# Altium footprint library HoangLong_Library.PcbLib: 81 footprints (part 1 of 6)
Each footprint in its own frame and in the unit in brackets; x right, y up, seen from the top. Pads: shape width x height; smd on the part's side, far side on the other; paste and mask are expansions set on the pad; w line width, h text height; cw(c..) or ccw(c..) is an arc to the next point about the centre after c.
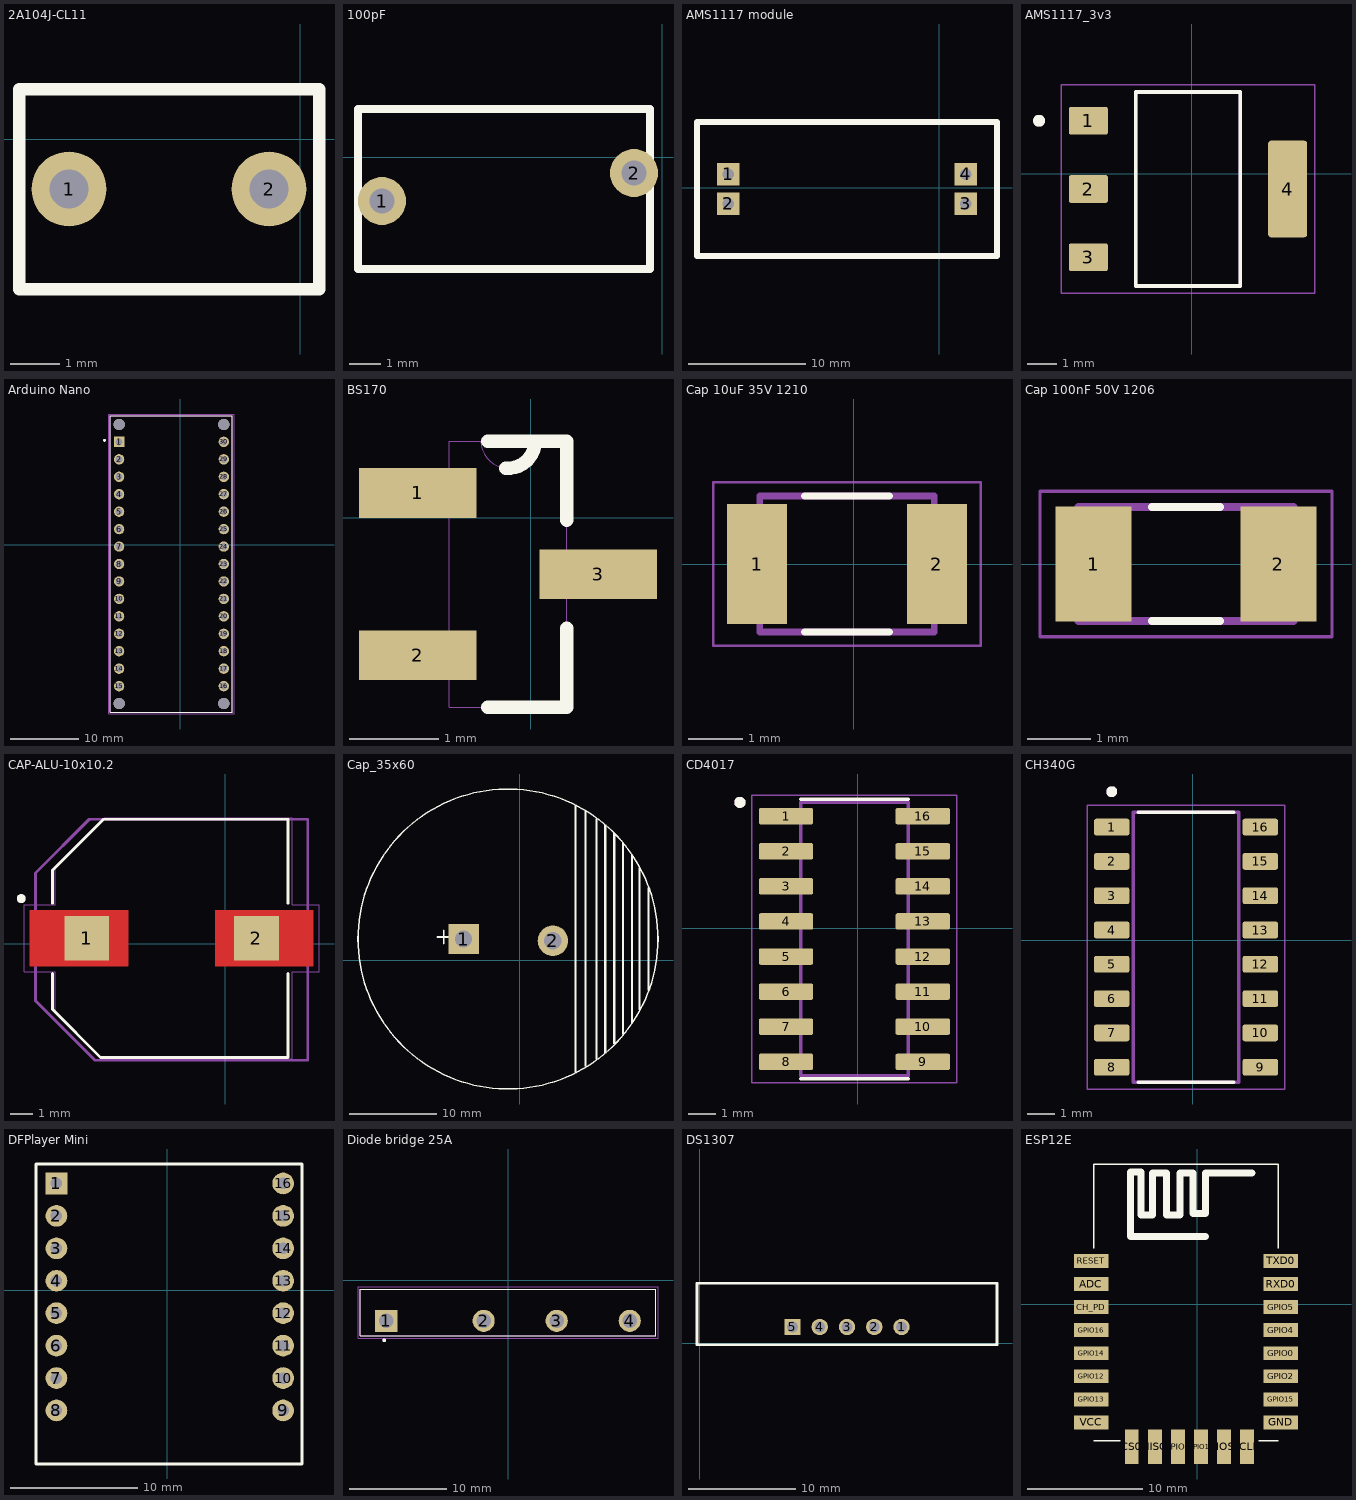
[diagram p0: the footprints below, top view; thin cyan lines are the x and y axes]

## 2A104J-CL11 [mil]
pads (2):
  round 60 hole 31.5: 1(-185,-40) 2(-25,-40)
Top Overlay:
  lines w10: -225,-120 -225,40 15,40 15,-120 -225,-120
3D body "polyester capacitor.STEP": height 503.94, standoff -66.93, extent -223.11,-117.48 13.11,40

## 100pF [mil]
pads (2):
  round 60 hole 31.5: 1(-350,-55) 2(-35,-20)
Top Overlay:
  lines w10: -380,-140 -380,-35 -380,60 -15,60 -15,-140 -380,-140
3D body "cdisk_p8x1_d9_th5.stp": height 511.64, standoff -118.11, extent -376.1,-138.43 -13.9,58.43

## AMS1117 module [mil]
pads (4):
  rect 75x75 hole 39.37: 1(-710,45) 2(-710,-55) 3(90,-55) 4(90,45)
Top Overlay:
  lines w19.68: -815,-230 -815,220 195,220 195,-230 -815,-230
3D body "AMS1117-POWER-Module.STEP": height 145.67, standoff 17.72, extent -811.97,-225.47 191.97,215.47

## AMS1117_3v3 [mm]
pads (4):
  rrect15% 1.31x0.93 smd: 1(-3.472,1.782) 2(-3.472,-0.508) 3(-3.472,-2.798)
  rrect15% 1.31x3.24 smd: 4(3.218,-0.508)
Top Overlay:
  circle w0.2: c-5.127,1.782 r0.1
  lines w0.127: -1.88,-3.761 1.626,-3.761 1.626,2.745 -1.88,2.745 -1.88,-3.761
Mechanical 13:
  circle w0.2: c-5.127,1.782 r0.1
  lines w0.127: -1.88,-3.761 1.626,-3.761 1.626,2.745 -1.88,2.745 -1.88,-3.761
Mechanical 15:
  lines w0.05: -4.377,-4.01 -4.377,2.994 4.123,2.994 4.123,-4.01 -4.377,-4.01
3D body "step_temp.STEP": height 1.8, standoff 0, extent -3.626,-3.759 3.372,2.743

## Arduino Nano [mil]
pads (34):
  rect 59.37x59.37 / inner round 59.37 / far side rect 59.37x59.37 hole 39.37: 1(-350,590)
  round 59.37 hole 39.37: 2(-350,490) 3(-350,390) 4(-350,290) 5(-350,190) 6(-350,90) 7(-350,-10) 8(-350,-110) 9(-350,-210) 10(-350,-310) 11(-350,-410) 12(-350,-510) 13(-350,-610) 14(-350,-710) 15(-350,-810) 16(250,-810) 17(250,-710) 18(250,-610) 19(250,-510) 20(250,-410) 21(250,-310) 22(250,-210) 23(250,-110) 24(250,-10) 25(250,90) 26(250,190) 27(250,290) 28(250,390) 29(250,490) 30(250,590)
  round 65 hole 65 unplated: ""(-350,-910) ""(-350,690) ""(250,-910) ""(250,690)
Top Overlay:
  circle w7.87: c-433.86,598.66 r3.94
  lines w5: -400,-960 300,-960 300,740 -400,740 -400,-960
Mechanical 13:
  circle w7.87: c-433.86,598.66 r3.94
  lines w5: -400,-960 -400,740 300,740 300,-960 -400,-960
Mechanical 15:
  lines w1.97: -409.84,-969.84 309.84,-969.84 309.84,749.84 -409.84,749.84 -409.84,-969.84
3D body "step_temp.STEP": height 496.06, standoff -236.22, extent -404.33,-960.39 304.33,811.26

## BS170 [mil] "BS170 MOSFET N-CH 60V 500mA"
pads (3):
  rect 52x22 smd: 1(-50,11) 2(-50,-61) 3(30,-25)
Top Overlay:
  lines w6: -19,-84 16,-84 16,-49 ; -19,34 2,34 16,34 16,-1 ; -11.04,22 ccw(c-10,33.96) 2,33.96
Mechanical 13:
  lines w0: -36,-71 -36,-84 16,-84 16,-35 ; -36,-71 -36,-51 ; -36,-71 -59,-71 -59,-51 -36,-51 ; -36,-51 -36,1 ; -36,1 -36,21 ; -36,1 -59,1 -59,21 -36,21 ; -36,21 -36,34 -22,34 ; -22,34 ccw(c-10,34) 2,34 ; -22,34 2,34 ; 2,34 16,34 16,-15 ; 16,-35 16,-15 ; 16,-35 39,-35 39,-15 16,-15
3D body "BS170F.STEP": height 43.31, standoff 0, extent -64.21,-82.09 34.21,32.09

## Cap 10uF 35V 1210 [mm]
pads (2):
  rect 1.1x2.2 smd: 1(-1.777,0) 2(1.523,0)
Top Overlay:
  lines w0.127: -0.907,-1.25 0.653,-1.25 ; -0.907,1.25 0.653,1.25
Mechanical 13:
  lines w0.127: -1.727,-1.25 1.473,-1.25 1.473,1.25 -1.727,1.25 -1.727,-1.25
Mechanical 15:
  lines w0.05: -2.577,-1.5 2.323,-1.5 2.323,1.5 -2.577,1.5 -2.577,-1.5
3D body "step_temp.STEP": height 2.8, standoff 0, extent -1.727,-1.25 1.473,1.25

## Cap 100nF 50V 1206 [mm]
pads (2):
  rect 1.2x1.82 smd: 1(-5.143,0) 2(-2.223,0)
Top Overlay:
  lines w0.127: -4.223,-0.9 -3.143,-0.9 ; -4.223,0.9 -3.143,0.9
Mechanical 13:
  lines w0.127: -5.383,-0.9 -5.383,0.9 -1.983,0.9 -1.983,-0.9 -5.383,-0.9
Mechanical 15:
  lines w0.05: -5.991,-1.15 -5.991,1.15 -1.375,1.15 -1.375,-1.15 -5.991,-1.15
3D body "step_temp.STEP": height 1.8, standoff 0, extent -5.283,-0.8 -2.083,0.8

## CAP-ALU-10x10.2 [mm]
pads (2):
  rect 2x2 smd paste-2 mask+0: 1(-6.213,0.254) 2(1.387,0.254)
Top Layer:
  region: 2.037,1.504 3.937,1.504 3.937,-0.996 2.037,-0.996 0.737,-0.996 -0.463,-0.996 -0.463,1.504 0.737,1.504
  region: -5.563,1.504 -4.363,1.504 -4.363,-0.996 -5.563,-0.996 -6.863,-0.996 -8.763,-0.996 -8.763,1.504 -6.863,1.504
Top Overlay:
  circle w0.2: c-9.144,2.032 r0.1
  lines w0.127: -7.747,-1.316 -7.747,-2.921 -5.588,-5.08 2.794,-5.08 2.794,-1.316 ; -7.747,1.824 -7.747,3.302 -5.461,5.588 2.794,5.588 2.794,1.824
Top Paste:
  region: 2.037,1.504 3.937,1.504 3.937,-0.996 2.037,-0.996 0.737,-0.996 -0.463,-0.996 -0.463,1.504 0.737,1.504
  region: -5.563,1.504 -4.363,1.504 -4.363,-0.996 -5.563,-0.996 -6.863,-0.996 -8.763,-0.996 -8.763,1.504 -6.863,1.504
Top Solder:
  region: 2.137,1.604 4.037,1.604 4.037,-1.096 2.137,-1.096 0.637,-1.096 -0.563,-1.096 -0.563,1.604 0.637,1.604
  region: -5.463,1.604 -4.263,1.604 -4.263,-1.096 -5.463,-1.096 -6.963,-1.096 -8.863,-1.096 -8.863,1.604 -6.963,1.604
Mechanical 13:
  circle w0.2: c-9.144,2.032 r0.1
  lines w0.127: -8.509,-2.54 -5.842,-5.207 3.683,-5.207 3.683,5.588 -6.096,5.588 -8.509,3.175 -8.509,-2.54
Mechanical 15:
  lines w0.05: -9.013,-1.246 -9.013,1.754 -7.62,1.754 -7.62,3.429 -5.395,5.654 2.987,5.654 2.987,1.754 4.187,1.754 4.187,-1.246 2.987,-1.246 2.987,-5.146 -5.522,-5.146 -7.62,-3.048 -7.62,-1.246 -9.013,-1.246
3D body "CAPAE-D10.0x10.2.stp": height 10.5, standoff 0, extent -8.413,-4.996 3.587,5.504

## Cap_35x60 [mm]
pads (2):
  rect 3.5x3.5 hole 2: 1(-6.477,2.464)
  round 3.5 hole 2: 2(3.785,2.261)
Top Overlay:
  circle w0.178: c-1.372,2.464 r17.221
  rectangle: 14.63,-3.429 14.884,8.382
  rectangle: 13.614,-5.715 13.868,10.668
  rectangle: 12.725,-7.239 12.979,12.192
  rectangle: 6.248,-12.954 6.502,17.907
  rectangle: 7.391,-12.167 7.645,17.272
  rectangle: 8.661,-11.379 8.915,16.307
  rectangle: 9.677,-10.668 9.931,15.596
  rectangle: 10.693,-9.576 10.947,14.605
  rectangle: 11.709,-8.509 11.963,13.538
  lines w0.178: -9.5,2.692 -7.976,2.692 ; -8.738,1.93 -8.738,3.454
3D body "35 x60 BLACK.stp": height 60.63, standoff -3.11, extent -18.848,-15.084 16.129,19.888

## CD4017 [mm] "SMD"
pads (16):
  rrect25% 1.97x0.6 smd: 1(-2.602,4.064) 2(-2.602,2.794) 3(-2.602,1.524) 4(-2.602,0.254) 5(-2.602,-1.016) 6(-2.602,-2.286) 7(-2.602,-3.556) 8(-2.602,-4.826) 9(2.348,-4.826) 10(2.348,-3.556) 11(2.348,-2.286) 12(2.348,-1.016) 13(2.348,0.254) 14(2.348,1.524) 15(2.348,2.794) 16(2.348,4.064)
Top Overlay:
  circle w0.2: c-4.272,4.564 r0.1
  lines w0.127: -2.077,-5.446 1.823,-5.446 ; -2.077,4.684 1.823,4.684
Mechanical 13:
  circle w0.2: c-4.272,4.564 r0.1
  lines w0.127: -2.077,-5.331 -2.077,4.569 1.823,4.569 1.823,-5.331 -2.077,-5.331
Mechanical 15:
  lines w0.05: -3.837,-5.581 -3.837,4.819 3.583,4.819 3.583,-5.581 -3.837,-5.581
3D body "step_temp.STEP": height 1.75, standoff 0, extent -3.124,-5.334 2.87,4.572

## CH340G [mm]
pads (16):
  rrect25% 1.31x0.62 smd: 1(-3.004,4.191) 2(-3.004,2.921) 3(-3.004,1.651) 4(-3.004,0.381) 5(-3.004,-0.889) 6(-3.004,-2.159) 7(-3.004,-3.429) 8(-3.004,-4.699) 9(2.496,-4.699) 10(2.496,-3.429) 11(2.496,-2.159) 12(2.496,-0.889) 13(2.496,0.381) 14(2.496,1.651) 15(2.496,2.921) 16(2.496,4.191)
Top Overlay:
  circle w0.2: c-3.004,5.501 r0.1
  lines w0.127: -2.029,-5.254 1.521,-5.254 ; -2.029,4.746 1.521,4.746
Mechanical 13:
  circle w0.2: c-3.004,5.501 r0.1
  lines w0.127: -2.204,-5.254 -2.204,4.746 1.696,4.746 1.696,-5.254 -2.204,-5.254
Mechanical 15:
  lines w0.05: -3.909,-5.504 -3.909,4.996 3.401,4.996 3.401,-5.504 -3.909,-5.504
3D body "step_temp.STEP": height 1.8, standoff 0, extent -3.254,-5.254 2.746,4.746

## DFPlayer Mini [mm]
pads (16):
  rect 1.7x1.7 hole 0.9: 1(-8.687,8.382)
  round 1.7 hole 0.9: 2(-8.687,5.842) 3(-8.687,3.302) 4(-8.687,0.762) 5(-8.687,-1.778) 6(-8.687,-4.318) 7(-8.687,-6.858) 8(-8.687,-9.398) 9(9.068,-9.398) 10(9.068,-6.858) 11(9.068,-4.318) 12(9.068,-1.778) 13(9.068,0.762) 14(9.068,3.302) 15(9.068,5.842) 16(9.068,8.382)
Top Overlay:
  lines w0.254: -10.287,-13.589 -10.287,9.906 10.541,9.906 10.541,-13.589 -10.287,-13.589
3D body "DFPlayer Mini Assem colored.step": height 8.2, standoff -3, extent -10.273,-13.554 10.527,9.906

## Diode bridge 25A [mm]
pads (4):
  rect 2.27x2.27 hole 1.51: 1(-12.5,-4.152)
  round 2.27 hole 1.51: 2(-2.5,-4.152) 3(5,-4.152) 4(12.5,-4.152)
Top Overlay:
  circle w0.2: c-12.7,-6.152 r0.1
  lines w0.127: -15.15,-5.702 -15.15,-0.902 15.15,-0.902 15.15,-5.702 -15.15,-5.702
Mechanical 13:
  circle w0.2: c-12.7,-6.152 r0.1
  lines w0.127: -15.15,-5.702 -15.15,-0.902 15.15,-0.902 15.15,-5.702 -15.15,-5.702
Mechanical 15:
  lines w0.05: -15.4,-5.952 -15.4,-0.652 15.4,-0.652 15.4,-5.952 -15.4,-5.952
3D body "step_temp.STEP": height 24.5, standoff -13.8, extent -15,-5.602 15,-1.002

## DS1307 [mil]
pads (5):
  round 60 hole 39.37: 1(740,60) 2(640,60) 3(540,60) 4(440,60)
  rect 60x60 hole 39.37: 5(340,60)
Top Overlay:
  lines w10: -10,-5 1090,-5 1090,220 -10,220 -10,-5
3D body "RTC 3017.SLDPRT.STEP": height 1125.59, standoff -102.76, extent -5.28,-2.48 1085.28,214.06

## ESP12E [mm]
pads (22):
  rect 3x1.2 smd: ADC(-9.189,1.768) CH_PD(-9.189,-0.232) GND(7.211,-10.232) GPIO0(7.211,-4.232) GPIO2(7.211,-6.232) GPIO4(7.211,-2.232) GPIO5(7.211,-0.232) GPIO12(-9.189,-6.232) GPIO13(-9.189,-8.232) GPIO14(-9.189,-4.232) GPIO15(7.211,-8.232) GPIO16(-9.189,-2.232) RESET(-9.189,3.768) RXD0(7.211,1.768) TXD0(7.211,3.768) VCC(-9.189,-10.232)
  rect 1.2x3 smd: CS0(-5.689,-12.332) GPIO9(-1.689,-12.332) GPIO10(0.311,-12.332) MISO(-3.689,-12.332) MOSI(2.311,-12.332) SCLK(4.311,-12.332)
Top Overlay:
  lines w0.127: -8.989,-11.832 -6.689,-11.832 ; -8.989,4.868 -8.989,12.168 7.011,12.168 7.011,4.868 ; 5.311,-11.832 7.011,-11.832
  lines w0.61: -5.789,6.468 -5.789,5.868 0.711,5.868 ; -5.789,6.568 -5.789,11.468 -4.889,11.468 -4.889,7.768 -3.889,7.768 -3.889,11.368 -2.689,11.368 -2.689,7.768 -1.489,7.768 -1.489,11.368 -0.389,11.368 -0.389,7.868 0.711,7.868 0.711,11.368 4.711,11.368
3D body "ESP_12_E.STEP": height 2.76, standoff 0.05, extent -9.016,-11.811 6.984,12.189